# Altium schematic symbol library IC_TI.SCHLIB: 1162 symbols (part 2 of 8) (continued)
## INA2141U (continued)

## ISO1050DUB
designator U?
Integrated Circuit; Manufacturer_Name: Texas Instruments; Manufacturer_Part_Number: ISO1050DUB; Datasheet Link: http://docs-emea.rs-online.com/webdocs/1299/0900766b812994b4.pdf; Height: 4.85mm; Mouser Part Number: 595-ISO1050DUB; Mouser Price/Stock: https://www.mouser.com/Search/Refine.aspx?Keyword=595-ISO1050DUB; RS Part Number: 7967994P; RS Price/Stock: http://uk.rs-online.com/web/p/products/7967994P
footprint SOP8 (SOP, 8-Leads, Body 9.6x6.7mm (max), Pitch 2.54mm, IPC Medium Density)
pins: 1 VCC1 (power), 2 RXD, 3 TXD, 4 GND1 (power), 5 GND2 (power), 6 CANL, 7 CANH, 8 VCC2 (power)

## ISO3080DW
designator U?
Integrated Circuit; Manufacturer_Name: Texas Instruments; Manufacturer_Part_Number: ISO3080DW; Datasheet Link: http://www.ti.com/lit/gpn/iso3080; Mouser Part Number: 595-ISO3080DW; Mouser Price/Stock: https://www.mouser.com/Search/Refine.aspx?Keyword=595-ISO3080DW; RS Part Number: 6607666P; RS Price/Stock: http://uk.rs-online.com/web/p/products/6607666P
footprint SOIC16W_1.27
pins: 1 VCC1, 2 GND_1_2, 3 R, 4 ~RE, 5 DE, 6 D, 7 GND_1, 8 GND_1_3, 9 GND_2_2, 10 GND_2, 11 Y, 12 Z, 13 B, 14 A, 15 GND_2_3, 16 VCC2

## ISO3082DW
designator U?
Integrated Circuit; Manufacturer_Name: Texas Instruments; Manufacturer_Part_Number: ISO3082DW; Datasheet Link: http://uk.rs-online.com/web/p/products/7092255; Height: 2.65mm; Mouser Part Number: 595-ISO3082DW; Mouser Price/Stock: https://www.mouser.com/Search/Refine.aspx?Keyword=595-ISO3082DW; RS Part Number: 7092255P; RS Price/Stock: http://uk.rs-online.com/web/p/products/7092255P
footprint SOIC16W_1.27
pins: 1 VCC1, 2 GND1_1, 3 R, 4 ~{RE}, 5 DE, 6 D, 7 GND1_2, 8 GND1_3, 9 GND2_1, 10 GND2_2, 11 NC_1, 12 A, 13 B, 14 NC_2, 15 GND2_3, 16 VCC2

## ISO7221MD
designator U?
Integrated Circuit; Manufacturer_Name: Texas Instruments; Manufacturer_Part_Number: ISO7221MD; Datasheet Link: http://www.ti.com/lit/gpn/iso7221m; Height: 1.75mm; Mouser Part Number: 595-ISO7221MD; Mouser Price/Stock: https://www.mouser.com/Search/Refine.aspx?Keyword=595-ISO7221MD; RS Part Number: 0459718P; RS Price/Stock: http://uk.rs-online.com/web/p/products/0459718P
footprint SOIC8_1.27 (SOP, 8-Leads, Pitch 1.27mm)
pins: 1 VCC1, 2 OUTA, 3 INB, 4 GND1, 5 GND2, 6 OUTB, 7 INA, 8 VCC2

## ISO7240CDW
designator U?
Integrated Circuit; Manufacturer_Name: Texas Instruments; Manufacturer_Part_Number: ISO7240CDW; Datasheet Link: http://www.ti.com/lit/gpn/iso7240c; Mouser Part Number: 595-ISO7240CDW; Mouser Price/Stock: https://www.mouser.com/Search/Refine.aspx?Keyword=595-ISO7240CDW; RS Part Number: 1218318; RS Price/Stock: http://uk.rs-online.com/web/p/products/1218318
footprint SOIC16W_1.27
pins: 1 VCC1, 2 GND_1, 3 INA, 4 INB, 5 INC, 6 IND, 7 NC, 8 GND_1_2, 9 GND_2, 10 EN, 11 OUTD, 12 OUTC, 13 OUTB, 14 OUTA, 15 GND_2_2, 16 VCC2

## ISO7240CFDWR
designator U?
Integrated Circuit; Manufacturer_Name: Texas Instruments; Manufacturer_Part_Number: ISO7240CFDWR; Datasheet Link: http://www.ti.com/lit/ds/symlink/iso7240cf.pdf; Height: 2.65mm; Mouser Part Number: 595-ISO7240CFDWR; Mouser Price/Stock: https://www.mouser.com/Search/Refine.aspx?Keyword=595-ISO7240CFDWR
footprint SOIC16W_1.27
pins: 1 VCC1, 2 GND1_1, 3 INA, 4 INB, 5 INC, 6 IND, 7 DISABLE, 8 GND1_2, 9 GND2_1, 10 CTRL, 11 OUTD, 12 OUTC, 13 OUTB, 14 OUTA, 15 GND2_2, 16 VCC2

## ISO7321CDR
designator U?
Integrated Circuit; Manufacturer_Name: Texas Instruments; Manufacturer_Part_Number: ISO7321CDR; Datasheet Link: http://www.ti.com/lit/ds/symlink/iso7321c.pdf; Height: 1.75mm; Mouser Part Number: 595-ISO7321CDR; Mouser Price/Stock: https://www.mouser.com/Search/Refine.aspx?Keyword=595-ISO7321CDR
footprint SOIC8_1.27 (SOP, 8-Leads, Pitch 1.27mm)
pins: 1 VCC1 (power), 2 OUTA (out), 3 INB (in), 4 GND1 (power), 5 GND2 (power), 6 OUTB (out), 7 INA (in), 8 VCC2 (power)

## ISO7641FMDW
designator U?
Integrated Circuit; Manufacturer_Name: Texas Instruments; Manufacturer_Part_Number: ISO7641FMDW; Datasheet Link: http://www.ti.com/lit/ds/symlink/iso7641fm.pdf; Height: 2.65mm; Mouser Part Number: 595-ISO7641FMDW; Mouser Price/Stock: https://www.mouser.com/Search/Refine.aspx?Keyword=595-ISO7641FMDW; RS Part Number: 8136595P; RS Price/Stock: http://uk.rs-online.com/web/p/products/8136595P
footprint SOIC16W_1.27
pins: 1 VCC1 (power), 2 GND1_1 (power), 3 INA (in), 4 INB (in), 5 INC (in), 6 OUTD (out), 7 EN1, 8 GND1_2 (power), 9 GND2_1 (power), 10 EN2, 11 IND (in), 12 OUTC (out), 13 OUTB (out), 14 OUTA (out), 15 GND2_2 (power), 16 VCC2 (power)

## LF347M
designator U?
Integrated Circuit; Manufacturer_Name: Texas Instruments; Manufacturer_Part_Number: LF347M; Datasheet Link: http://www.ti.com/lit/ds/symlink/lf347-n.pdf; Height: 1.75mm; Mouser Part Number: 926-LF347M; Mouser Price/Stock: https://www.mouser.com/Search/Refine.aspx?Keyword=926-LF347M; RS Part Number: 4716068
footprint SOIC14_1.27
pins: 1 OUT1 (out), 2 IN1- (in), 3 IN1+ (in), 4 V+, 5 IN2+ (in), 6 IN2- (in), 7 OUT2 (out), 8 OUT3 (out), 9 IN3- (in), 10 IN3+ (in), 11 V-, 12 IN4+ (in), 13 IN4- (in), 14 OUT4 (out)

## LF347N
designator U?
Integrated Circuit; Manufacturer_Name: Texas Instruments; Manufacturer_Part_Number: LF347N; Datasheet Link: http://www.ti.com/lit/ds/symlink/lf347-n.pdf; Height: 5.334mm; Mouser Part Number: 595-LF347N; Mouser Price/Stock: https://www.mouser.com/Search/Refine.aspx?Keyword=595-LF347N; RS Part Number: 9223025; RS Price/Stock: http://uk.rs-online.com/web/p/products/9223025
footprint DIP14-A
pins: 1 1OUT (out), 2 1IN- (in), 3 1IN+ (in), 4 VCC+ (power), 5 2IN+ (in), 6 2IN- (in), 7 2OUT (out), 8 3OUT (out), 9 3IN- (in), 10 3IN+ (in), 11 VCC- (power), 12 4IN+ (in), 13 4IN- (in), 14 4OUT (out)

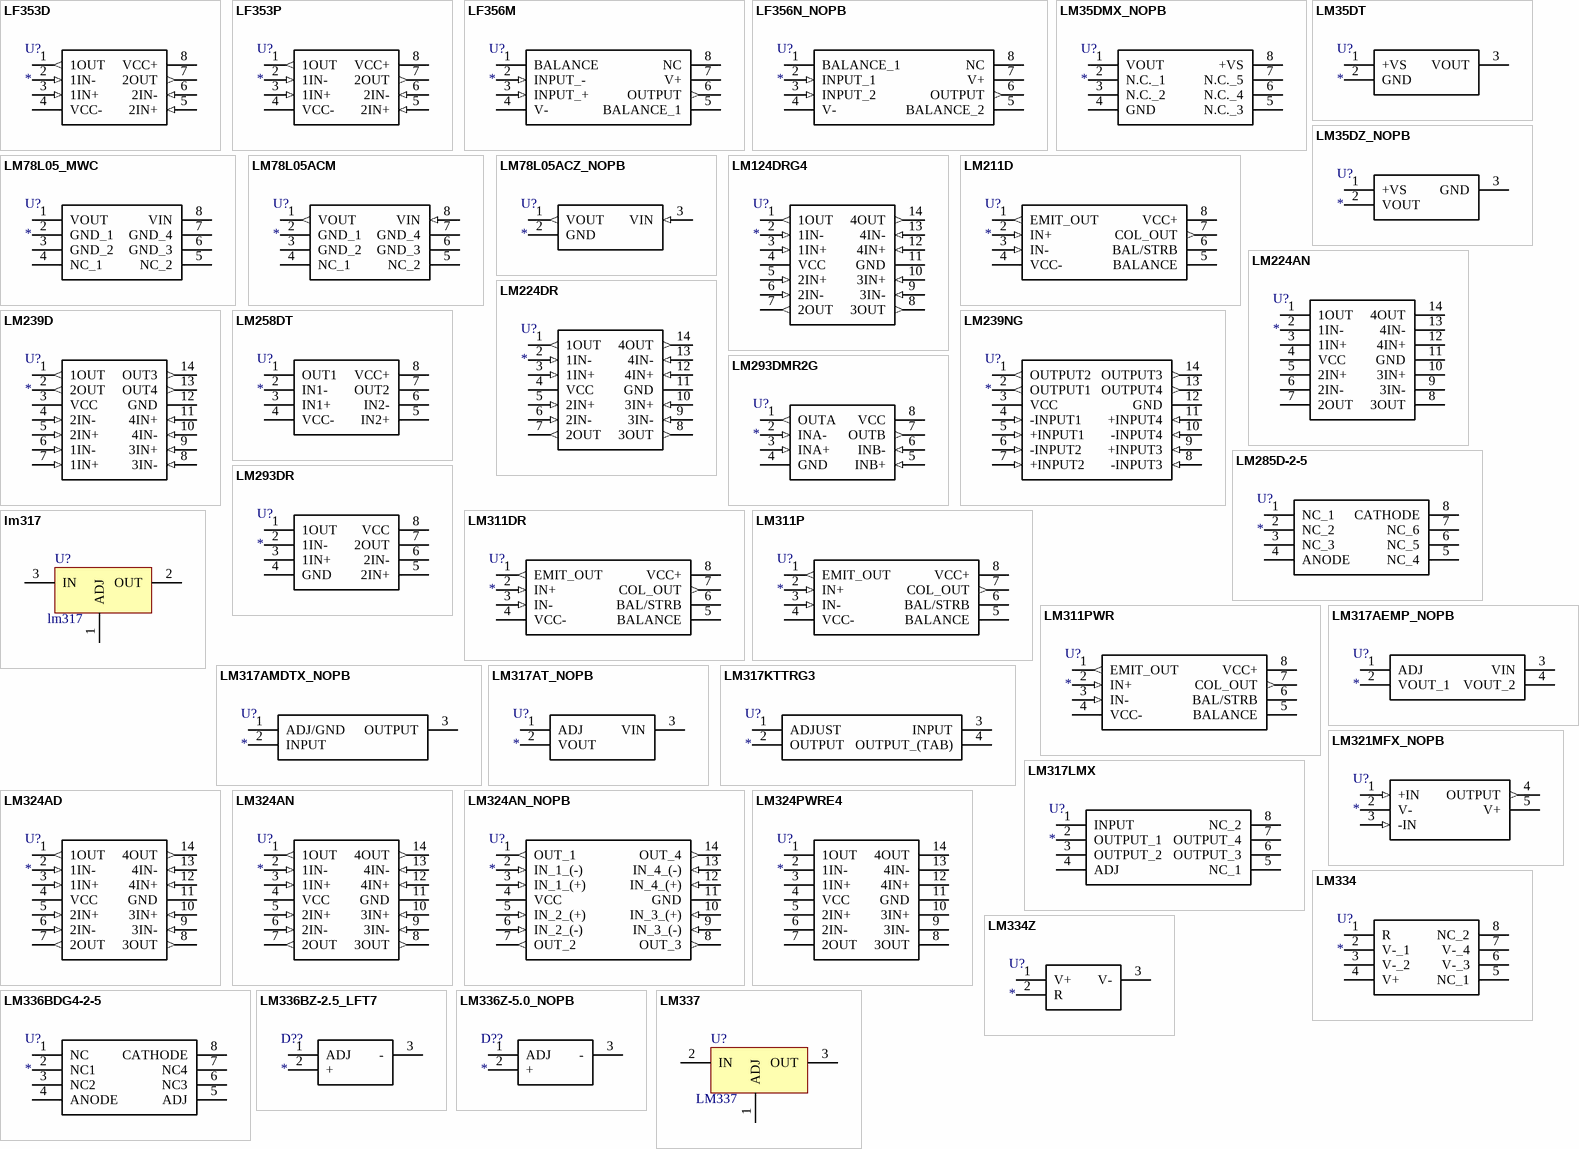
[diagram p7: symbols LF353D to LM337]

## LF353D
designator U?
Integrated Circuit; Manufacturer_Name: Texas Instruments; Manufacturer_Part_Number: LF353D; Datasheet Link: http://docs-emea.rs-online.com/webdocs/061e/0900766b8061ec93.pdf; Height: 1.75mm; Mouser Part Number: 595-LF353D; Mouser Price/Stock: https://www.mouser.com/Search/Refine.aspx?Keyword=595-LF353D; RS Part Number: 6610476P; RS Price/Stock: http://uk.rs-online.com/web/p/products/6610476P
footprint SOIC8_1.27 (SOP, 8-Leads, Pitch 1.27mm)
pins: 1 1OUT (out), 2 1IN- (in), 3 1IN+ (in), 4 VCC- (power), 5 2IN+ (in), 6 2IN- (in), 7 2OUT (out), 8 VCC+ (power)

## LF353P
designator U?
Integrated Circuit; Manufacturer_Name: Texas Instruments; Manufacturer_Part_Number: LF353P; Datasheet Link: http://www.ti.com/lit/ds/symlink/lf353.pdf; Height: 5.08mm; Mouser Part Number: 595-LF353P; Mouser Price/Stock: https://www.mouser.com/Search/Refine.aspx?Keyword=595-LF353P; RS Part Number: 0527300; RS Price/Stock: http://uk.rs-online.com/web/p/products/0527300
footprint DIP8-A
pins: 1 1OUT (out), 2 1IN- (in), 3 1IN+ (in), 4 VCC- (power), 5 2IN+ (in), 6 2IN- (in), 7 2OUT (out), 8 VCC+ (power)

## LF356M
designator U?
Integrated Circuit; Manufacturer_Name: Texas Instruments; Manufacturer_Part_Number: LF356M; Datasheet Link: http://www.ti.com/lit/ds/symlink/lf356.pdf; Height: 1.75mm; Mouser Part Number: 926-LF356M; Mouser Price/Stock: https://www.mouser.com/Search/Refine.aspx?Keyword=926-LF356M; RS Part Number: 3794629; RS Price/Stock: http://uk.rs-online.com/web/p/products/3794629
footprint SOIC8_1.27 (SOP, 8-Leads, Pitch 1.27mm)
pins: 1 BALANCE, 2 INPUT_- (in), 3 INPUT_+ (in), 4 V-, 5 BALANCE_1, 6 OUTPUT (out), 7 V+, 8 NC

## LF356N_NOPB
designator U?
Integrated Circuit; Manufacturer_Name: Texas Instruments; Manufacturer_Part_Number: LF356N/NOPB; Datasheet Link: http://www.ti.com/lit/ds/symlink/lf356.pdf; Height: 5.08mm; Mouser Part Number: 926-LF356N/NOPB; Mouser Price/Stock: https://www.mouser.com/Search/Refine.aspx?Keyword=926-LF356N%2FNOPB; RS Part Number: 2509473820; RS Price/Stock: http://uk.rs-online.com/web/p/products/2509473820
footprint DIP8-A
pins: 1 BALANCE_1, 2 INPUT_1 (in), 3 INPUT_2 (in), 4 V-, 5 BALANCE_2, 6 OUTPUT (out), 7 V+, 8 NC

## LM35DMX_NOPB
designator U?
Integrated Circuit; Manufacturer_Name: Texas Instruments; Manufacturer_Part_Number: LM35DMX/NOPB; Datasheet Link: http://www.ti.com/lit/gpn/lm35; Height: 1.75mm; Mouser Part Number: 926-LM35DMX/NOPB; Mouser Price/Stock: https://www.mouser.com/Search/Refine.aspx?Keyword=926-LM35DMX%2FNOPB
footprint SOIC8_1.27 (SOP, 8-Leads, Pitch 1.27mm)
pins: 1 VOUT, 2 N.C._1, 3 N.C._2, 4 GND, 5 N.C._3, 6 N.C._4, 7 N.C._5, 8 +VS

## LM35DT
designator U?
Integrated Circuit; Manufacturer_Name: Texas Instruments; Manufacturer_Part_Number: LM35DT; Datasheet Link: http://www.ti.com/lit/ds/symlink/lm35.pdf; Height: 4.7mm; Mouser Part Number: 926-LM35DT; Mouser Price/Stock: https://www.mouser.com/Search/Refine.aspx?Keyword=926-LM35DT; RS Part Number: 4714034; RS Price/Stock: http://uk.rs-online.com/web/p/products/4714034
footprint TO220-3
pins: 1 +VS, 2 GND, 3 VOUT

## LM35DZ_NOPB
designator U?
Integrated Circuit; Manufacturer_Name: Texas Instruments; Manufacturer_Part_Number: LM35DZ/NOPB; Datasheet Link: http://www.ti.com/lit/gpn/lm35; Mouser Part Number: 926-LM35DZ/NOPB; Mouser Price/Stock: https://www.mouser.com/Search/Refine.aspx?Keyword=926-LM35DZ%2FNOPB; RS Part Number: 1451341; RS Price/Stock: http://uk.rs-online.com/web/p/products/1451341
footprint TO92
pins: 1 +VS, 2 VOUT, 3 GND

## LM78L05_MWC
designator U?
Integrated Circuit; Manufacturer_Name: Texas Instruments; Manufacturer_Part_Number: LM78L05 MWC; Datasheet Link: http://users.ece.utexas.edu/~valvano/Datasheets/LM78L05.pdf; Height: 1.753mm; Mouser Part Number: N/A; Mouser Price/Stock: http://www.mouser.com/Search/ProductDetail.aspx?qs=51W%2fvVdgODiFWRIHF6UwhA%3d%3d
footprint SOIC8_1.27 (SOP, 8-Leads, Pitch 1.27mm)
pins: 1 VOUT, 2 GND_1, 3 GND_2, 4 NC_1, 5 NC_2, 6 GND_3, 7 GND_4, 8 VIN

## LM78L05ACM
designator U?
Integrated Circuit; Manufacturer_Name: Texas Instruments; Manufacturer_Part_Number: LM78L05ACM; Datasheet Link: http://www.ti.com/lit/ds/symlink/lm78l05.pdf; Height: 1.75mm; Mouser Part Number: 926-LM78L05ACM; Mouser Price/Stock: https://www.mouser.com/Search/Refine.aspx?Keyword=926-LM78L05ACM; RS Part Number: 0857020A; RS Price/Stock: http://uk.rs-online.com/web/p/products/0857020A
footprint SOIC8_1.27 (SOP, 8-Leads, Pitch 1.27mm)
pins: 1 VOUT (out), 2 GND_1 (power), 3 GND_2 (power), 4 NC_1, 5 NC_2, 6 GND_3 (power), 7 GND_4 (power), 8 VIN (in)

## LM78L05ACZ_NOPB
designator U?
Integrated Circuit; Manufacturer_Name: Texas Instruments; Manufacturer_Part_Number: LM78L05ACZ/NOPB; Datasheet Link: http://www.ti.com/lit/ds/symlink/lm78l.pdf; Mouser Part Number: 926-LM78L05ACZ/NOPB; Mouser Price/Stock: https://www.mouser.com/Search/Refine.aspx?Keyword=926-LM78L05ACZ%2FNOPB; RS Part Number: 2508123772; RS Price/Stock: http://uk.rs-online.com/web/p/products/2508123772
footprint TO92
pins: 1 VOUT (out), 2 GND (power), 3 VIN (in)

## LM124DRG4
designator U?
Integrated Circuit; Manufacturer_Name: Texas Instruments; Manufacturer_Part_Number: LM124DRG4; Datasheet Link: http://www.ti.com/lit/ds/symlink/lm124.pdf; Height: 1.75mm; Mouser Part Number: 595-LM124DRG4; Mouser Price/Stock: https://www.mouser.com/Search/Refine.aspx?Keyword=595-LM124DRG4; RS Part Number: 1456542; RS Price/Stock: http://uk.rs-online.com/web/p/products/1456542
footprint SOIC14_1.27
pins: 1 1OUT (out), 2 1IN- (in), 3 1IN+ (in), 4 VCC (power), 5 2IN+ (in), 6 2IN- (in), 7 2OUT (out), 8 3OUT (out), 9 3IN- (in), 10 3IN+ (in), 11 GND (power), 12 4IN+ (in), 13 4IN- (in), 14 4OUT (out)

## LM211D
designator U?
Integrated Circuit; Manufacturer_Name: Texas Instruments; Manufacturer_Part_Number: LM211D; Datasheet Link: http://www.ti.com/lit/ds/symlink/lm211.pdf; Height: 1.75mm; Mouser Part Number: 595-LM211D; Mouser Price/Stock: https://www.mouser.com/Search/Refine.aspx?Keyword=595-LM211D; RS Part Number: 1791657; RS Price/Stock: http://uk.rs-online.com/web/p/products/1791657
footprint SOIC8_1.27 (SOP, 8-Leads, Pitch 1.27mm)
pins: 1 EMIT_OUT (out), 2 IN+ (in), 3 IN- (in), 4 VCC- (power), 5 BALANCE, 6 BAL/STRB, 7 COL_OUT (out), 8 VCC+ (power)

## LM224AN
designator U?
Integrated Circuit; Manufacturer_Name: Texas Instruments; Manufacturer_Part_Number: LM224AN; Datasheet Link: http://www.ti.com/lit/gpn/lm224a; Height: 5.08mm; Mouser Part Number: 595-LM224AN; Mouser Price/Stock: https://www.mouser.com/Search/Refine.aspx?Keyword=595-LM224AN
footprint DIP14-A
pins: 1 1OUT, 2 1IN-, 3 1IN+, 4 VCC, 5 2IN+, 6 2IN-, 7 2OUT, 8 3OUT, 9 3IN-, 10 3IN+, 11 GND, 12 4IN+, 13 4IN-, 14 4OUT

## LM224DR
designator U?
Integrated Circuit; Manufacturer_Name: Texas Instruments; Manufacturer_Part_Number: LM224DR; Datasheet Link: http://www.ti.com/lit/gpn/lm224; Height: 1.75mm; Mouser Part Number: 595-LM224DR; Mouser Price/Stock: https://www.mouser.com/Search/Refine.aspx?Keyword=595-LM224DR; RS Part Number: 0527748; RS Price/Stock: http://uk.rs-online.com/web/p/products/0527748
footprint SOIC14_1.27
pins: 1 1OUT (out), 2 1IN- (in), 3 1IN+ (in), 4 VCC (power), 5 2IN+ (in), 6 2IN- (in), 7 2OUT (out), 8 3OUT (out), 9 3IN- (in), 10 3IN+ (in), 11 GND (power), 12 4IN+ (in), 13 4IN- (in), 14 4OUT (out)

## LM239D
designator U?
Integrated Circuit; Manufacturer_Name: Texas Instruments; Manufacturer_Part_Number: LM239D; Datasheet Link: http://www.ti.com/lit/ds/symlink/lm239.pdf; Height: 1.75mm; Mouser Part Number: 595-LM239D; Mouser Price/Stock: https://www.mouser.com/Search/Refine.aspx?Keyword=595-LM239D; RS Part Number: 6612775; RS Price/Stock: http://uk.rs-online.com/web/p/comparators/6612775/?source=DS
footprint SOIC14_1.27
pins: 1 1OUT (out), 2 2OUT (out), 3 VCC (power), 4 2IN- (in), 5 2IN+ (in), 6 1IN- (in), 7 1IN+ (in), 8 3IN- (in), 9 3IN+ (in), 10 4IN- (in), 11 4IN+ (in), 12 GND (power), 13 OUT4 (out), 14 OUT3 (out)

## LM239NG
designator U?
Integrated Circuit; Manufacturer_Name: ON Semiconductor; Manufacturer_Part_Number: LM239NG; Allied_Number: 70466104; Datasheet Link: http://www.onsemi.com/pub/Collateral/LM339-D.PDF; Height: 5.33mm; Mouser Part Number: 863-LM239NG; Mouser Price/Stock: https://www.mouser.com/Search/Refine.aspx?Keyword=863-LM239NG; RS Part Number: 8051312P; RS Price/Stock: http://uk.rs-online.com/web/p/products/8051312P; Allied Price/Stock: http://www.alliedelec.com/on-semiconductor-lm239ng/70466104/
footprint DIP14-A
pins: 1 OUTPUT2 (out), 2 OUTPUT1 (out), 3 VCC (power), 4 -INPUT1 (in), 5 +INPUT1 (in), 6 -INPUT2 (in), 7 +INPUT2 (in), 8 -INPUT3 (in), 9 +INPUT3 (in), 10 -INPUT4 (in), 11 +INPUT4 (in), 12 GND (power), 13 OUTPUT4 (out), 14 OUTPUT3 (out)

## LM258DT
designator U?
Integrated Circuit; Manufacturer_Name: STMicroelectronics; Manufacturer_Part_Number: LM258DT; Allied_Number: 70390301; Datasheet Link: http://www.st.com/st-web-ui/static/active/en/resource/technical/document/datasheet/CD00000464.pdf; Height: 1.75mm; Mouser Part Number: 511-LM258D-TR; Mouser Price/Stock: https://www.mouser.com/Search/Refine.aspx?Keyword=511-LM258D-TR; RS Part Number: 1785158; RS Price/Stock: http://uk.rs-online.com/web/p/products/1785158; Allied Price/Stock: http://www.alliedelec.com/stmicroelectronics-lm258dt/70390301/
footprint SOIC8_1.27 (SOP, 8-Leads, Pitch 1.27mm)
pins: 1 OUT1, 2 IN1-, 3 IN1+, 4 VCC-, 5 IN2+, 6 IN2-, 7 OUT2, 8 VCC+

## LM285D-2-5
designator U?
Integrated Circuit; Manufacturer_Name: Texas Instruments; Manufacturer_Part_Number: LM285D-2-5; Datasheet Link: http://www.ti.com/lit/ds/symlink/lm285-2.5.pdf; Height: 1.75mm; Mouser Part Number: 595-LM285D-2-5; Mouser Price/Stock: https://www.mouser.com/Search/Refine.aspx?Keyword=595-LM285D-2-5; RS Part Number: 7968023P; RS Price/Stock: http://uk.rs-online.com/web/p/products/7968023P
footprint SOIC8_1.27 (SOP, 8-Leads, Pitch 1.27mm)
pins: 1 NC_1, 2 NC_2, 3 NC_3, 4 ANODE, 5 NC_4, 6 NC_5, 7 NC_6, 8 CATHODE

## LM293DMR2G
designator U?
Integrated Circuit; Manufacturer_Name: ON Semiconductor; Manufacturer_Part_Number: LM293DMR2G; Allied_Number: 70339772; Datasheet Link: http://docs-emea.rs-online.com/webdocs/1276/0900766b81276ee3.pdf; Height: 1.1mm; Mouser Part Number: 863-LM293DMR2G; Mouser Price/Stock: https://www.mouser.com/Search/Refine.aspx?Keyword=863-LM293DMR2G; RS Part Number: 1629349; RS Price/Stock: http://uk.rs-online.com/web/p/products/1629349; Allied Price/Stock: http://www.alliedelec.com/on-semiconductor-lm293dmr2g/70339772/
footprint VSSOP8_0.65-PAD
pins: 1 OUTA (out), 2 INA- (in), 3 INA+ (in), 4 GND (power), 5 INB+ (in), 6 INB- (in), 7 OUTB (out), 8 VCC (power)

## LM293DR
designator U?
Integrated Circuit; Manufacturer_Name: Texas Instruments; Manufacturer_Part_Number: LM293DR; Datasheet Link: http://www.ti.com/lit/gpn/lm293; Height: 1.75mm; Mouser Part Number: 595-LM293DR; Mouser Price/Stock: https://www.mouser.com/Search/Refine.aspx?Keyword=595-LM293DR; RS Part Number: 0527738; RS Price/Stock: http://uk.rs-online.com/web/p/products/0527738
footprint SOIC8_1.27 (SOP, 8-Leads, Pitch 1.27mm)
pins: 1 1OUT, 2 1IN-, 3 1IN+, 4 GND, 5 2IN+, 6 2IN-, 7 2OUT, 8 VCC

## LM311DR
designator U?
Integrated Circuit; Manufacturer_Name: Texas Instruments; Manufacturer_Part_Number: LM311DR; Datasheet Link: http://www.ti.com/lit/ds/symlink/lm311.pdf; Height: 1.75mm; Mouser Part Number: 595-LM311DR; Mouser Price/Stock: https://www.mouser.com/Search/Refine.aspx?Keyword=595-LM311DR; RS Part Number: 0528157; RS Price/Stock: http://uk.rs-online.com/web/p/products/0528157
footprint SOIC8_1.27 (SOP, 8-Leads, Pitch 1.27mm)
pins: 1 EMIT_OUT (out), 2 IN+ (in), 3 IN- (in), 4 VCC- (power), 5 BALANCE, 6 BAL/STRB, 7 COL_OUT (out), 8 VCC+ (power)

## LM311P
designator U?
Integrated Circuit; Manufacturer_Name: Texas Instruments; Manufacturer_Part_Number: LM311P; Datasheet Link: http://www.ti.com/lit/ds/symlink/lm311.pdf; Height: 5.08mm; Mouser Part Number: 595-LM311P; Mouser Price/Stock: https://www.mouser.com/Search/Refine.aspx?Keyword=595-LM311P; RS Part Number: 0428458P; RS Price/Stock: http://uk.rs-online.com/web/p/products/0428458P
footprint DIP8-A
pins: 1 EMIT_OUT (out), 2 IN+ (in), 3 IN- (in), 4 VCC- (power), 5 BALANCE, 6 BAL/STRB, 7 COL_OUT (out), 8 VCC+ (power)

## LM311PWR
designator U?
Integrated Circuit; Manufacturer_Name: Texas Instruments; Manufacturer_Part_Number: LM311PWR; Datasheet Link: http://www.ti.com/lit/ds/symlink/lm311.pdf; Height: 1.2mm; Mouser Part Number: 595-LM311PWR; Mouser Price/Stock: https://www.mouser.com/Search/Refine.aspx?Keyword=595-LM311PWR
footprint TSSOP8_0.65
pins: 1 EMIT_OUT (out), 2 IN+ (in), 3 IN- (in), 4 VCC- (power), 5 BALANCE, 6 BAL/STRB, 7 COL_OUT (out), 8 VCC+ (power)

## lm317
designator U?
footprint TO263-3
pins: 1 ADJ, 2 OUT, 3 IN

## LM317AEMP_NOPB
designator U?
Integrated Circuit; Manufacturer_Name: Texas Instruments; Manufacturer_Part_Number: LM317AEMP/NOPB; Datasheet Link: http://www.ti.com/lit/gpn/lm317a; Height: 1.8mm; Mouser Part Number: 926-LM317AEMP/NOPB; Mouser Price/Stock: https://www.mouser.com/Search/Refine.aspx?Keyword=926-LM317AEMP%2FNOPB; RS Part Number: 9216894; RS Price/Stock: http://uk.rs-online.com/web/p/products/9216894
footprint SOT223
pins: 1 ADJ, 2 VOUT_1, 3 VIN, 4 VOUT_2

## LM317AMDTX_NOPB
designator U?
Integrated Circuit; Manufacturer_Name: Texas Instruments; Manufacturer_Part_Number: LM317AMDTX/NOPB; Datasheet Link: http://www.ti.com/lit/gpn/lm317a; Mouser Part Number: 926-LM317AMDTX/NOPB; Mouser Price/Stock: https://www.mouser.com/Search/Refine.aspx?Keyword=926-LM317AMDTX%2FNOPB
footprint TO252
pins: 1 ADJ/GND, 2 INPUT, 3 OUTPUT

## LM317AT_NOPB
designator U?
Integrated Circuit; Manufacturer_Name: Texas Instruments; Manufacturer_Part_Number: LM317AT/NOPB; Datasheet Link: http://www.ti.com/lit/gpn/lm317a; Height: 4.7mm; Mouser Part Number: 926-LM317AT/NOPB; Mouser Price/Stock: https://www.mouser.com/Search/Refine.aspx?Keyword=926-LM317AT%2FNOPB; RS Part Number: 5335698P; RS Price/Stock: http://uk.rs-online.com/web/p/products/5335698P
footprint TO220-3
pins: 1 ADJ, 2 VOUT, 3 VIN

## LM317KTTRG3
designator U?
Integrated Circuit; Manufacturer_Name: Texas Instruments; Manufacturer_Part_Number: LM317KTTRG3; Datasheet Link: http://www.ti.com/lit/ds/s; Mouser Part Number: 595-LM317KTTRG3; Mouser Price/Stock: https://www.mouser.com/Search/Refine.aspx?Keyword=595-LM317KTTRG3
footprint TO263-3
pins: 1 ADJUST, 2 OUTPUT, 3 INPUT, 4 OUTPUT_(TAB)

## LM317LMX
designator U?
Integrated Circuit; Manufacturer_Name: ON Semiconductor; Manufacturer_Part_Number: LM317LMX; Datasheet Link: https://www.fairchildsemi.com/datasheets/LM/LM317L.pdf; Height: 1.75mm; RS Part Number: 9034302P; RS Price/Stock: http://uk.rs-online.com/web/p/products/9034302P
footprint SOIC8_1.27 (SOP, 8-Leads, Pitch 1.27mm)
pins: 1 INPUT, 2 OUTPUT_1, 3 OUTPUT_2, 4 ADJ, 5 NC_1, 6 OUTPUT_3, 7 OUTPUT_4, 8 NC_2

## LM321MFX_NOPB
designator U?
Integrated Circuit; Manufacturer_Name: Texas Instruments; Manufacturer_Part_Number: LM321MFX/NOPB; Datasheet Link: http://www.ti.com/lit/gpn/lm321; Height: 1.45mm; Mouser Part Number: 926-LM321MFX/NOPB; Mouser Price/Stock: https://www.mouser.com/Search/Refine.aspx?Keyword=926-LM321MFX%2FNOPB
footprint SOT23-5 (SOT23, 5-Leads, Body 3.0x3.0mm (max), Pitch 0.95mm, IPC Medium Density)
pins: 1 +IN (in), 2 V- (power), 3 -IN (in), 4 OUTPUT (out), 5 V+ (power)

## LM324AD
designator U?
Integrated Circuit; Manufacturer_Name: Texas Instruments; Manufacturer_Part_Number: LM324AD; Datasheet Link: http://www.ti.com/lit/ds/symlink/lm324a.pdf; Height: 1.75mm; Mouser Part Number: 595-LM324AD; Mouser Price/Stock: https://www.mouser.com/Search/Refine.aspx?Keyword=595-LM324AD; RS Part Number: 9203453; RS Price/Stock: http://uk.rs-online.com/web/p/products/9203453
footprint SOIC14_1.27
pins: 1 1OUT (out), 2 1IN- (in), 3 1IN+ (in), 4 VCC (power), 5 2IN+ (in), 6 2IN- (in), 7 2OUT (out), 8 3OUT (out), 9 3IN- (in), 10 3IN+ (in), 11 GND (power), 12 4IN+ (in), 13 4IN- (in), 14 4OUT (out)

## LM324AN
designator U?
Integrated Circuit; Manufacturer_Name: Texas Instruments; Manufacturer_Part_Number: LM324AN; Datasheet Link: http://www.ti.com/lit/ds/symlink/lm324a.pdf; Height: 5.08mm; Mouser Part Number: 595-LM324AN; Mouser Price/Stock: https://www.mouser.com/Search/Refine.aspx?Keyword=595-LM324AN; RS Part Number: 2508717138; RS Price/Stock: http://uk.rs-online.com/web/p/products/2508717138
footprint DIP14-A
pins: 1 1OUT (out), 2 1IN- (in), 3 1IN+ (in), 4 VCC (power), 5 2IN+ (in), 6 2IN- (in), 7 2OUT (out), 8 3OUT (out), 9 3IN- (in), 10 3IN+ (in), 11 GND (power), 12 4IN+ (in), 13 4IN- (in), 14 4OUT (out)

## LM324AN_NOPB
designator U?
Integrated Circuit; Manufacturer_Name: Texas Instruments; Manufacturer_Part_Number: LM324AN/NOPB; Datasheet Link: http://www.ti.com/lit/gpn/lm324-n; Height: 5.08mm; Mouser Part Number: 926-LM324AN/NOPB; Mouser Price/Stock: https://www.mouser.com/Search/Refine.aspx?Keyword=926-LM324AN%2FNOPB
footprint DIP14-A
pins: 1 OUT_1 (out), 2 IN_1_(-) (in), 3 IN_1_(+) (in), 4 VCC (power), 5 IN_2_(+) (in), 6 IN_2_(-) (in), 7 OUT_2 (out), 8 OUT_3 (out), 9 IN_3_(-) (in), 10 IN_3_(+) (in), 11 GND (power), 12 IN_4_(+) (in), 13 IN_4_(-) (in), 14 OUT_4 (out)

## LM324PWRE4
designator U?
Integrated Circuit; Manufacturer_Name: Texas Instruments; Manufacturer_Part_Number: LM324PWRE4; Datasheet Link: http://www.ti.com/lit/ds/symlink/lm324.pdf; Height: 1.2mm; Mouser Part Number: 595-LM324PWRE4; Mouser Price/Stock: https://www.mouser.com/Search/Refine.aspx?Keyword=595-LM324PWRE4
footprint TSSOP14_0.65 (TSOP, 14-Leads, Body 5.00x4.40mm, Pitch 0.65mm, Thermal Pad 2.31x2.46mm, IPC Low Density)
pins: 1 1OUT, 2 1IN-, 3 1IN+, 4 VCC, 5 2IN+, 6 2IN-, 7 2OUT, 8 3OUT, 9 3IN-, 10 3IN+, 11 GND, 12 4IN+, 13 4IN-, 14 4OUT

## LM334
designator U?
Integrated Circuit; Manufacturer_Name: Texas Instruments; Manufacturer_Part_Number: LM334; Datasheet Link: http://www.ti.com/product/LM334; Height: 1.75mm
footprint SOIC8_1.27 (SOP, 8-Leads, Pitch 1.27mm)
pins: 1 R, 2 V-_1, 3 V-_2, 4 V+, 5 NC_1, 6 V-_3, 7 V-_4, 8 NC_2

## LM334Z
designator U?
Integrated Circuit; Manufacturer_Name: Texas Instruments; Manufacturer_Part_Number: LM334Z; Datasheet Link: http://www.ti.com/lit/ds/symlink/lm334.pdf; Mouser Part Number: 926-LM334Z; Mouser Price/Stock: https://www.mouser.com/Search/Refine.aspx?Keyword=926-LM334Z; RS Part Number: 4715807; RS Price/Stock: http://uk.rs-online.com/web/p/products/4715807
footprint TO92
pins: 1 V+, 2 R, 3 V-

## LM336BDG4-2-5
designator U?
Integrated Circuit; Manufacturer_Name: Texas Instruments; Manufacturer_Part_Number: LM336BDG4-2-5; Datasheet Link: http://www.ti.com/lit/ds/symlink/lm336b-2.5.pdf; Height: 1.75mm; Mouser Part Number: 595-LM336BDG4-2-5; Mouser Price/Stock: http://www.mouser.com/Search/ProductDetail.aspx?qs=tP77tliwutBaY9WB528%2fhQ%3d%3d; RS Part Number: 1450650; RS Price/Stock: http://uk.rs-online.com/web/p/products/1450650
footprint SOIC8_1.27 (SOP, 8-Leads, Pitch 1.27mm)
pins: 1 NC, 2 NC1, 3 NC2, 4 ANODE, 5 ADJ, 6 NC3, 7 NC4, 8 CATHODE

## LM336BZ-2.5_LFT7
designator D??
Diode; Manufacturer_Name: Texas Instruments; Manufacturer_Part_Number: LM336BZ-2.5/LFT7; Datasheet Link: http://www.ti.com/lit/ds/symlink/lm336-2.5-n.pdf; Mouser Part Number: 926-LM336BZ-25/LFT7; Mouser Price/Stock: https://www.mouser.com/Search/Refine.aspx?Keyword=926-LM336BZ-25%2FLFT7
footprint TO92
pins: 1 ADJ, 2 +, 3 -

## LM336Z-5.0_NOPB
designator D??
Diode; Manufacturer_Name: Texas Instruments; Manufacturer_Part_Number: LM336Z-5.0/NOPB; Datasheet Link: http://www.ti.com/lit/gpn/lm336-5.0; Height: 4mm; Mouser Part Number: 926-LM336Z-50/NOPB; Mouser Price/Stock: https://www.mouser.com/Search/Refine.aspx?Keyword=926-LM336Z-50%2FNOPB; RS Part Number: 5337903; RS Price/Stock: http://uk.rs-online.com/web/p/products/5337903
footprint TO92
pins: 1 ADJ, 2 +, 3 -

## LM337
designator U?
footprint TO263-3
pins: 1 ADJ, 2 IN, 3 OUT
